# Altium footprint library goldpin_pcb.PcbLib: 235 footprints (part 5 of 15)
Each footprint in its own frame and in the unit in brackets; x right, y up, seen from the top. Pads: shape width x height; smd on the part's side, far side on the other; paste and mask are expansions set on the pad; w line width, h text height; cw(c..) or ccw(c..) is an arc to the next point about the centre after c.
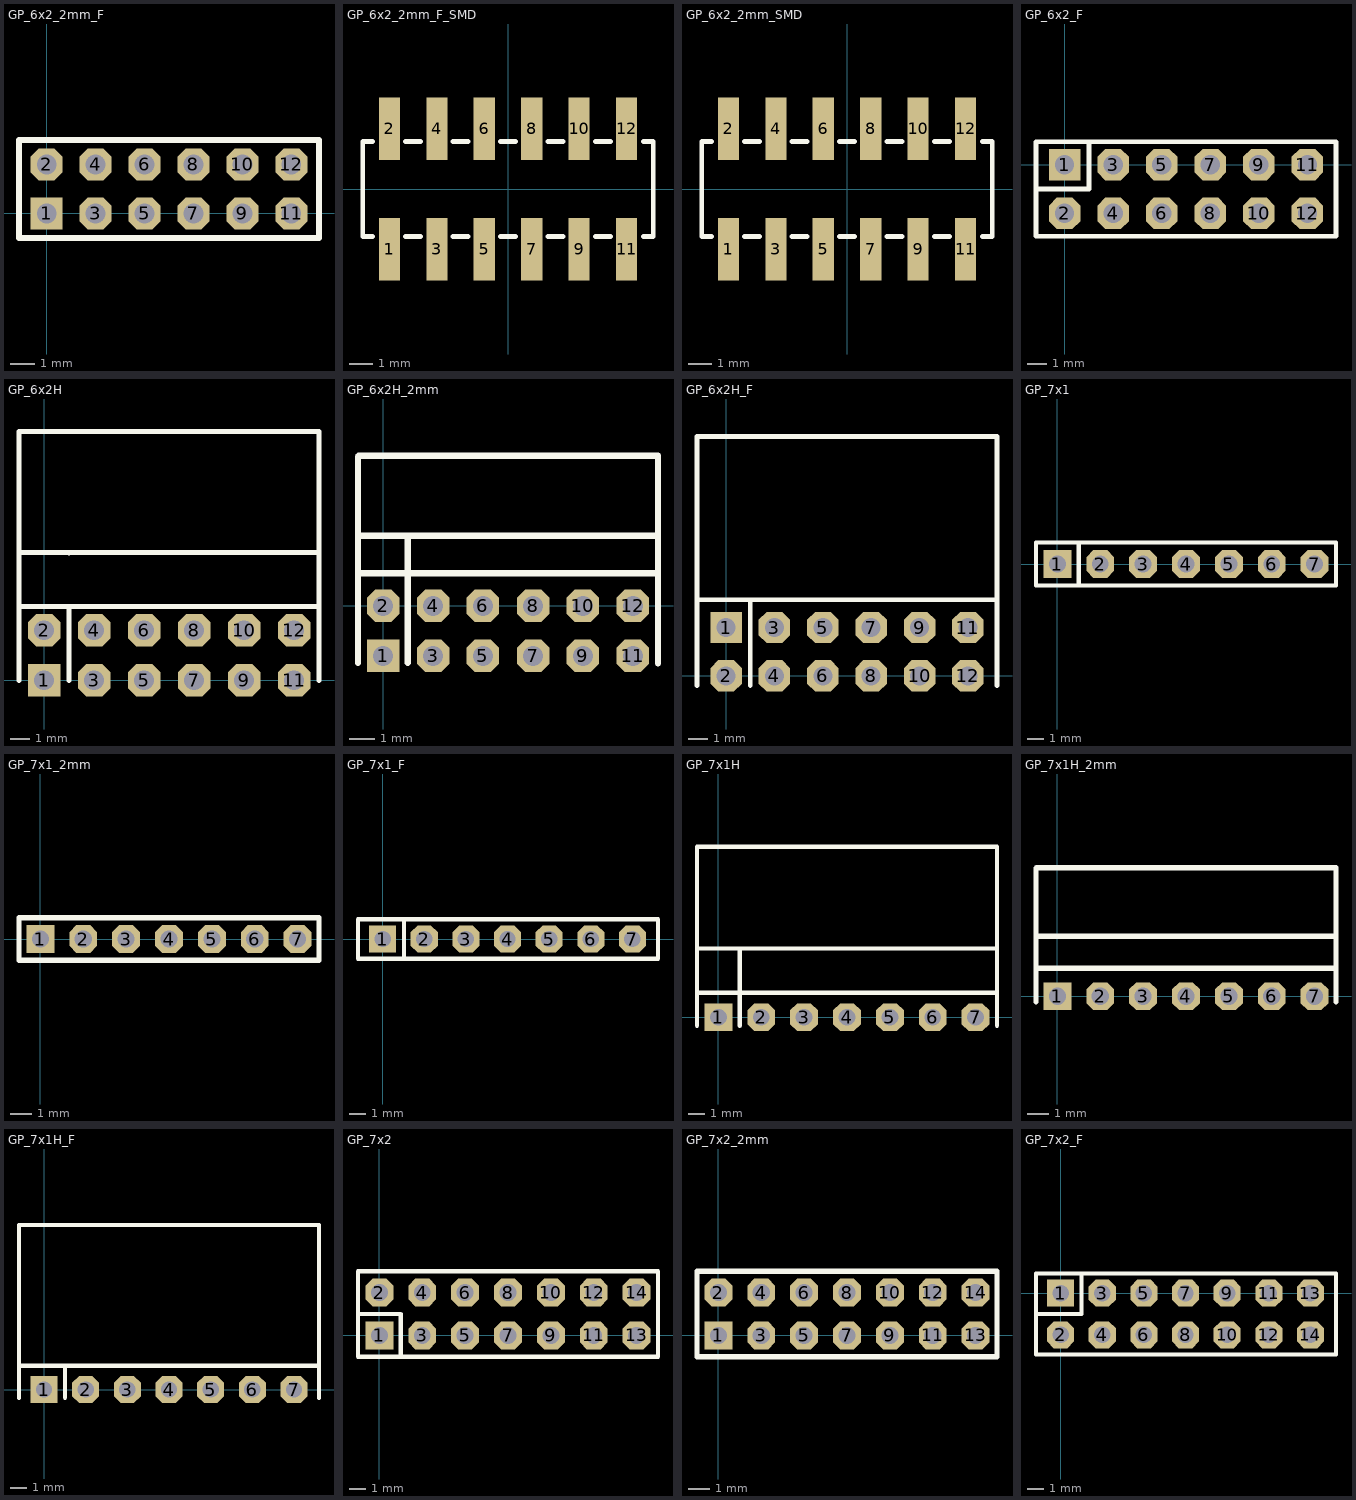
[diagram p4: the footprints below, top view; thin cyan lines are the x and y axes]

## GP_6x2_2mm_F [mm]
height 4.45
pads (12):
  rect 1.3x1.3 hole 0.8: 1(0,0)
  oct 1.3x1.3 hole 0.8: 2(0,2) 3(2,0) 4(2,2) 5(4,0) 6(4,2) 7(6,0) 8(6,2) 9(8,0) 10(8,2) 11(10,0) 12(10,2)
Top Overlay:
  lines w0.254: -1.125,-1 -1.125,2.999 11.125,2.999 11.125,-1 -1.125,-1
3D body: height 4.44, standoff -2.92, extent -1.125,-0.999 11.115,2.999

## GP_6x2_2mm_F_SMD [mm]
pads (12):
  rect 0.89x2.65 smd: 1(-5,-2.54) 2(-5,2.54) 3(-3,-2.54) 4(-3,2.54) 5(-1,-2.54) 6(-1,2.54) 7(1,-2.54) 8(1,2.54) 9(3,-2.54) 10(3,2.54) 11(5,-2.54) 12(5,2.54)
Top Overlay:
  lines w0.2: -5.7,-2 -6.125,-2 -6.125,2 -5.7,2 ; -4.325,-2 -3.675,-2 ; -4.325,2 -3.675,2 ; -2.325,-2 -1.675,-2 ; -2.325,2 -1.675,2 ; -0.325,-2 0.325,-2 ; -0.325,2 0.325,2 ; 1.675,-2 2.325,-2 ; 1.675,2 2.325,2 ; 3.675,-2 4.325,-2 ; 3.675,2 4.325,2 ; 5.7,-2 6.125,-2 6.125,2 5.7,2
3D body: height 4.44, standoff -0.05, extent -6.125,-3.218 6.115,3.218

## GP_6x2_2mm_SMD [mm]
pads (12):
  rect 0.89x2.65 smd: 1(-5,-2.54) 2(-5,2.54) 3(-3,-2.54) 4(-3,2.54) 5(-1,-2.54) 6(-1,2.54) 7(1,-2.54) 8(1,2.54) 9(3,-2.54) 10(3,2.54) 11(5,-2.54) 12(5,2.54)
Top Overlay:
  lines w0.2: -5.7,-2 -6.125,-2 -6.125,2 -5.7,2 ; -4.325,-2 -3.675,-2 ; -4.325,2 -3.675,2 ; -2.325,-2 -1.675,-2 ; -2.325,2 -1.675,2 ; -0.325,-2 0.325,-2 ; -0.325,2 0.325,2 ; 1.675,-2 2.325,-2 ; 1.675,2 2.325,2 ; 3.675,-2 4.325,-2 ; 3.675,2 4.325,2 ; 5.7,-2 6.125,-2 6.125,2 5.7,2
3D body: height 5.9, standoff -0.07, extent -6,-3.27 6,3.334

## GP_6x2_F [mil]
pads (12):
  rect 65x65 hole 39.37: 1(0,0)
  oct 65x65 hole 39.37: 2(0,-100) 3(100,0) 4(100,-100) 5(200,0) 6(200,-100) 7(300,0) 8(300,-100) 9(400,0) 10(400,-100) 11(500,0) 12(500,-100)
Top Overlay:
  lines w10: -59.06,-50 50,-50 50,47.51 ; -59.06,-147.49 559.06,-147.49 559.06,47.51 -59.06,47.51 -59.06,-147.49
3D body: height 335, standoff -104, extent -60,-147.49 560,47.51

## GP_6x2H [mil]
pads (12):
  rect 65x65 hole 39.37: 1(0,0)
  oct 65x65 hole 39.37: 2(0,100) 3(100,0) 4(100,100) 5(200,0) 6(200,100) 7(300,0) 8(300,100) 9(400,0) 10(400,100) 11(500,0) 12(500,100)
Top Overlay:
  lines w10: -50,0 -50,180.31 -50,497.64 550,497.64 550,0 ; -50,147.24 550,147.24 ; -50,255.51 550,255.51 ; 49.21,255.51 50,254.72 ; 50,0 50,147.24
3D body: height 220.08, standoff -89.92, extent -50,-12.5 550,490

## GP_6x2H_2mm [mm]
height 4.45
pads (12):
  rect 1.3x1.3 hole 0.8: 1(0,-2)
  oct 1.3x1.3 hole 0.8: 2(0,0) 3(2,-2) 4(2,0) 5(4,-2) 6(4,0) 7(6,-2) 8(6,0) 9(8,-2) 10(8,0) 11(10,-2) 12(10,0)
Top Overlay:
  lines w0.254: -1,-2.275 -1,1.822 -1,5.973 ; -1,1.3 11,1.3 ; -1,2.8 11,2.8 ; 0.99,-2.275 0.99,2.775 ; 11,-2.3 11,6
  lines w0.256: -1,5.973 -0.973,6 11,6
3D body: height 3.97, standoff -3.02, extent -1.025,-2.261 10.975,5.961

## GP_6x2H_F [mil]
pads (12):
  rect 65x65 hole 39.37: 1(0,100)
  oct 65x65 hole 39.37: 2(0,0) 3(100,100) 4(100,0) 5(200,100) 6(200,0) 7(300,100) 8(300,0) 9(400,100) 10(400,0) 11(500,100) 12(500,0)
Top Overlay:
  lines w10: -60,-20 -60,495 560,495 560,-20 ; -60,157.24 560,157.24 ; 50,-20 50,157.24
3D body: height 197.89, standoff -97.11, extent -59.06,-10.87 560.94,492.13

## GP_7x1 [mil]
pads (7):
  rect 65x65 hole 39.37: 1(0,0)
  oct 65x65 hole 39.37: 2(100,0) 3(200,0) 4(300,0) 5(400,0) 6(500,0) 7(600,0)
Top Overlay:
  lines w10: 50,-50 50,50 ; -50,-50 -50,50 650,50 650,-50 -50,-50
3D body: height 330, standoff -115, extent -50,-50 650,50

## GP_7x1_2mm [mm]
height 4.45
pads (7):
  rect 1.3x1.3 hole 0.8: 1(0,0)
  oct 1.3x1.3 hole 0.8: 2(2,0) 3(4,0) 4(6,0) 5(8,0) 6(10,0) 7(12,0)
Top Overlay:
  lines w0.254: -1,-1 -1,1 13,1 13,-1 -1,-1
3D body: height 5.51, standoff -2.69, extent -1,-0.99 13,0.991

## GP_7x1_F [mil]
pads (7):
  rect 65x65 hole 39.37: 1(0,0)
  oct 65x65 hole 39.37: 2(100,0) 3(200,0) 4(300,0) 5(400,0) 6(500,0) 7(600,0)
Top Overlay:
  lines w10: 51.18,-47.24 51.18,47.24 ; -59.06,-47.24 661.42,-47.24 661.42,47.24 -59.06,47.24 -59.06,-47.24
3D body: height 335, standoff -104, extent -60,-47.5 660,47.5

## GP_7x1H [mil]
pads (7):
  rect 65x65 hole 39.37: 1(0,0)
  oct 65x65 hole 39.37: 2(100,0) 3(200,0) 4(300,0) 5(400,0) 6(500,0) 7(600,0)
Top Overlay:
  lines w10: -50,-19.68 -50,80.31 -50,397.64 650,397.64 650,-19.68 ; -50,57.24 650,57.24 ; -50,160.51 650,160.51 ; 50,-19.68 50,80.31 50,160.51
3D body: height 120, standoff -90, extent -50,-10 650,392.5

## GP_7x1H_2mm [mm]
height 4.45
pads (7):
  rect 1.3x1.3 hole 0.8: 1(0,0)
  oct 1.3x1.3 hole 0.8: 2(2,0) 3(4,0) 4(6,0) 5(8,0) 6(10,0) 7(12,0)
Top Overlay:
  lines w0.254: -1,-0.25 -1,1.822 -1,5.973 ; -1,1.3 13,1.3 ; -1,2.8 13,2.8
  lines w0.256: -1,5.973 -0.973,6 13,6 13,-0.25
3D body: height 1.99, standoff -3.04, extent -1,-0.25 13,5.973

## GP_7x1H_F [mil]
pads (7):
  rect 65x65 hole 39.37: 1(0,0)
  oct 65x65 hole 39.37: 2(100,0) 3(200,0) 4(300,0) 5(400,0) 6(500,0) 7(600,0)
Top Overlay:
  lines w10: -60,-20 -60,395 660,395 660,-20 ; -60,57.24 660,57.24 ; 50,-19.68 50,57.24
3D body: height 96.71, standoff -98.29, extent -60,-10 660,393

## GP_7x2 [mil]
pads (14):
  rect 65x65 hole 39.37: 1(0,0)
  oct 65x65 hole 39.37: 2(0,100) 3(100,0) 4(100,100) 5(200,0) 6(200,100) 7(300,0) 8(300,100) 9(400,0) 10(400,100) 11(500,0) 12(500,100) 13(600,0) 14(600,100)
Top Overlay:
  lines w10: -50,50 50,50 50,-50 ; -50,-50 -50,150 650,150 650,-50 -50,-50
3D body: height 330, standoff -115, extent -50,-50 650,150

## GP_7x2_2mm [mm]
height 4.45
pads (14):
  rect 1.3x1.3 hole 0.8: 1(0,0)
  oct 1.3x1.3 hole 0.8: 2(0,2) 3(2,0) 4(2,2) 5(4,0) 6(4,2) 7(6,0) 8(6,2) 9(8,0) 10(8,2) 11(10,0) 12(10,2) 13(12,0) 14(12,2)
Top Overlay:
  lines w0.254: -1,-1 -1,2.999 13,2.999 13,-1 -1,-1
3D body: height 6.51, standoff -1.69, extent -1,-0.968 13,2.969

## GP_7x2_F [mil]
pads (14):
  rect 65x65 hole 39.37: 1(0,0)
  oct 65x65 hole 39.37: 2(0,-100) 3(100,0) 4(100,-100) 5(200,0) 6(200,-100) 7(300,0) 8(300,-100) 9(400,0) 10(400,-100) 11(500,0) 12(500,-100) 13(600,0) 14(600,-100)
Top Overlay:
  lines w10: -59.06,-50 50,-50 50,47.51 ; -59.06,-147.49 -59.06,47.51 661.42,47.51 661.42,-147.49 -59.06,-147.49
3D body: height 335, standoff -104, extent -60,-147.49 660,47.51